# Altium schematic symbol library Regulator_Switching.SchLib: 1070 symbols (part 6 of 9)
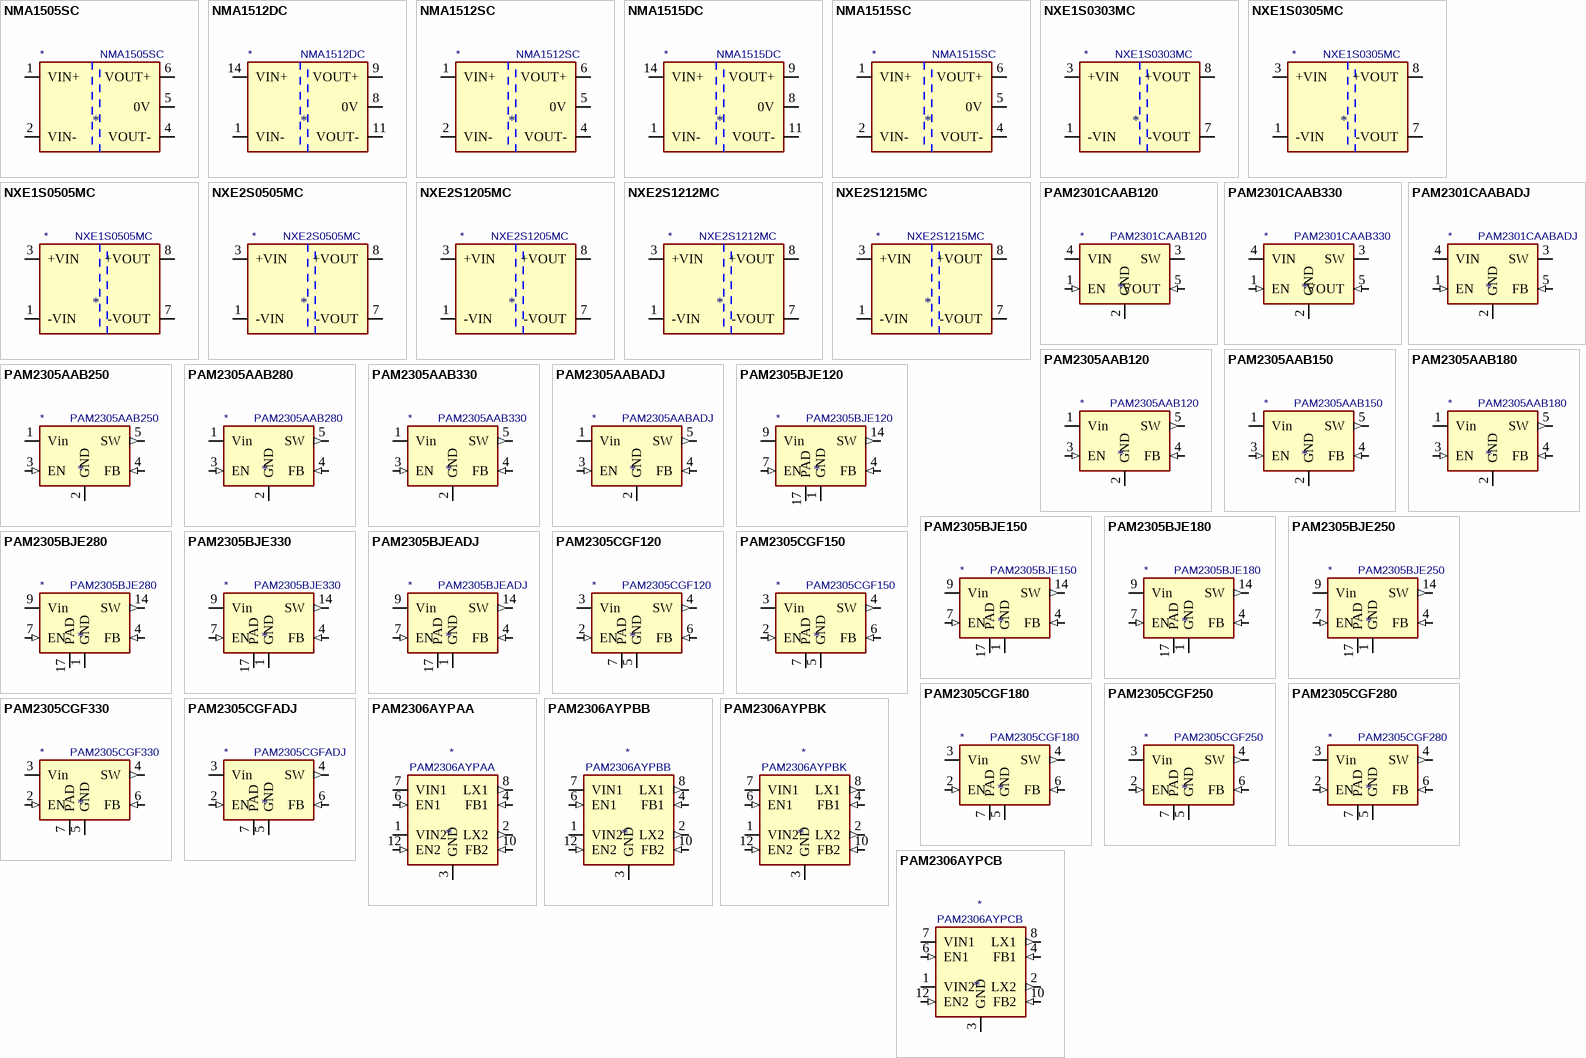
[diagram p31: symbols NMA1505SC to PAM2306AYPCB]

## PAM2301CAAB330
designator *  value PAM2301CAAB330
ki_keywords: Voltage regulator switching buck fixed output analog; ki_description: 800mA, Step-Down DC/DC-Converter, 3.3V Fixed Output Voltage, 1.5MHz, TSOT-23-5; ki_fp_filters: TSOT?23*; Footprint: Package_TO_SOT_SMD:TSOT-23-5; Supplier: https://www.diodes.com/assets/Datasheets/products_inactive_data/PAM2301.pdf
footprint TSOT-23-5
pins: 1 EN (in), 2 GND (power), 3 SW (power), 4 VIN (power), 5 VOUT (in)

## PAM2301CAABADJ
designator *  value PAM2301CAABADJ
ki_keywords: Voltage regulator switching buck fixed output analog; ki_description: 800mA, Step-Down DC/DC-Converter, Adjustable Output Voltage, 1.5MHz, TSOT-23-5; ki_fp_filters: TSOT?23*; Footprint: Package_TO_SOT_SMD:TSOT-23-5; Supplier: https://www.diodes.com/assets/Datasheets/products_inactive_data/PAM2301.pdf
footprint TSOT-23-5
pins: 1 EN (in), 2 GND (power), 3 SW (power), 4 VIN (power), 5 FB (in)

## PAM2305AAB120
designator *  value PAM2305AAB120
ki_keywords: Voltage regulator switching buck fixed output analog; ki_description: 1A, Step-Down DC/DC-Converter, 1.2V Fixed Output Voltage, 1.5MHz, TSOT-23; ki_fp_filters: TSOT?23*; Footprint: Package_TO_SOT_SMD:TSOT-23-5; Supplier: https://www.diodes.com/assets/Datasheets/PAM2305.pdf
footprint TSOT-23-5
pins: 1 Vin (power), 2 GND (power), 3 EN (in), 4 FB (in), 5 SW (out)

## PAM2305AAB150
designator *  value PAM2305AAB150
ki_keywords: Voltage regulator switching buck fixed output analog; ki_description: 1A, Step-Down DC/DC-Converter, 1.5V Fixed Output Voltage, 1.5MHz, TSOT-23; ki_fp_filters: TSOT?23*; Footprint: Package_TO_SOT_SMD:TSOT-23-5; Supplier: https://www.diodes.com/assets/Datasheets/PAM2305.pdf
footprint TSOT-23-5
pins: 1 Vin (power), 2 GND (power), 3 EN (in), 4 FB (in), 5 SW (out)

## PAM2305AAB180
designator *  value PAM2305AAB180
ki_keywords: Voltage regulator switching buck fixed output analog; ki_description: 1A, Step-Down DC/DC-Converter, 1.8V Fixed Output Voltage, 1.5MHz, TSOT-23; ki_fp_filters: TSOT?23*; Footprint: Package_TO_SOT_SMD:TSOT-23-5; Supplier: https://www.diodes.com/assets/Datasheets/PAM2305.pdf
footprint TSOT-23-5
pins: 1 Vin (power), 2 GND (power), 3 EN (in), 4 FB (in), 5 SW (out)

## PAM2305AAB250
designator *  value PAM2305AAB250
ki_keywords: Voltage regulator switching buck fixed output analog; ki_description: 1A, Step-Down DC/DC-Converter, 2.5V Fixed Output Voltage, 1.5MHz, TSOT-23; ki_fp_filters: TSOT?23*; Footprint: Package_TO_SOT_SMD:TSOT-23-5; Supplier: https://www.diodes.com/assets/Datasheets/PAM2305.pdf
footprint TSOT-23-5
pins: 1 Vin (power), 2 GND (power), 3 EN (in), 4 FB (in), 5 SW (out)

## PAM2305AAB280
designator *  value PAM2305AAB280
ki_keywords: Voltage regulator switching buck fixed output analog; ki_description: 1A, Step-Down DC/DC-Converter, 2.8V Fixed Output Voltage, 1.5MHz, TSOT-23; ki_fp_filters: TSOT?23*; Footprint: Package_TO_SOT_SMD:TSOT-23-5; Supplier: https://www.diodes.com/assets/Datasheets/PAM2305.pdf
footprint TSOT-23-5
pins: 1 Vin (power), 2 GND (power), 3 EN (in), 4 FB (in), 5 SW (out)

## PAM2305AAB330
designator *  value PAM2305AAB330
ki_keywords: Voltage regulator switching buck fixed output analog; ki_description: 1A, Step-Down DC/DC-Converter, 3.3V Fixed Output Voltage, 1.5MHz, TSOT-23; ki_fp_filters: TSOT?23*; Footprint: Package_TO_SOT_SMD:TSOT-23-5; Supplier: https://www.diodes.com/assets/Datasheets/PAM2305.pdf
footprint TSOT-23-5
pins: 1 Vin (power), 2 GND (power), 3 EN (in), 4 FB (in), 5 SW (out)

## PAM2305AABADJ
designator *  value PAM2305AABADJ
ki_keywords: Voltage regulator switching buck fixed output analog; ki_description: 1A, Step-Down DC/DC-Converter, Adjustable Output Voltage, 1.5MHz, TSOT-23; ki_fp_filters: TSOT?23*; Footprint: Package_TO_SOT_SMD:TSOT-23-5; Supplier: https://www.diodes.com/assets/Datasheets/PAM2305.pdf
footprint TSOT-23-5
pins: 1 Vin (power), 2 GND (power), 3 EN (in), 4 FB (in), 5 SW (out)

## PAM2305BJE120
designator *  value PAM2305BJE120
ki_keywords: Voltage regulator switching buck fixed output analog; ki_description: 1A, Step-Down DC/DC-Converter, 1.2V Fixed Output Voltage, 1.5MHz, QFN-16; ki_fp_filters: QFN*EP*3x3mm*P0.5mm*; Footprint: Package_DFN_QFN:QFN-16-1EP_3x3mm_P0.5mm_EP1.7x1.7mm; Supplier: https://www.diodes.com/assets/Datasheets/PAM2305.pdf
footprint QFN-16-1EP_3x3mm_P0.5mm_EP1.7x1.7mm
pins: 1 GND (power), 2 GND hidden, 3 GND hidden, 4 FB (in), 5 GND hidden, 6 NC (in) hidden, 7 EN (in), 8 NC (in) hidden, 9 Vin (power), 10 Vin hidden, 11 Vin hidden, 12 Vin hidden, 13 SW hidden, 14 SW (out), 15 SW hidden, 16 NC (in) hidden, 17 PAD

## PAM2305BJE150
designator *  value PAM2305BJE150
ki_keywords: Voltage regulator switching buck fixed output analog; ki_description: 1A, Step-Down DC/DC-Converter, 1.5V Fixed Output Voltage, 1.5MHz, QFN-16; ki_fp_filters: QFN*EP*3x3mm*P0.5mm*; Footprint: Package_DFN_QFN:QFN-16-1EP_3x3mm_P0.5mm_EP1.7x1.7mm; Supplier: https://www.diodes.com/assets/Datasheets/PAM2305.pdf
footprint QFN-16-1EP_3x3mm_P0.5mm_EP1.7x1.7mm
pins: 1 GND (power), 2 GND hidden, 3 GND hidden, 4 FB (in), 5 GND hidden, 6 NC (in) hidden, 7 EN (in), 8 NC (in) hidden, 9 Vin (power), 10 Vin hidden, 11 Vin hidden, 12 Vin hidden, 13 SW hidden, 14 SW (out), 15 SW hidden, 16 NC (in) hidden, 17 PAD

## PAM2305BJE180
designator *  value PAM2305BJE180
ki_keywords: Voltage regulator switching buck fixed output analog; ki_description: 1A, Step-Down DC/DC-Converter, 1.8V Fixed Output Voltage, 1.5MHz, QFN-16; ki_fp_filters: QFN*EP*3x3mm*P0.5mm*; Footprint: Package_DFN_QFN:QFN-16-1EP_3x3mm_P0.5mm_EP1.7x1.7mm; Supplier: https://www.diodes.com/assets/Datasheets/PAM2305.pdf
footprint QFN-16-1EP_3x3mm_P0.5mm_EP1.7x1.7mm
pins: 1 GND (power), 2 GND hidden, 3 GND hidden, 4 FB (in), 5 GND hidden, 6 NC (in) hidden, 7 EN (in), 8 NC (in) hidden, 9 Vin (power), 10 Vin hidden, 11 Vin hidden, 12 Vin hidden, 13 SW hidden, 14 SW (out), 15 SW hidden, 16 NC (in) hidden, 17 PAD

## PAM2305BJE250
designator *  value PAM2305BJE250
ki_keywords: Voltage regulator switching buck fixed output analog; ki_description: 1A, Step-Down DC/DC-Converter, 2.5V Fixed Output Voltage, 1.5MHz, QFN-16; ki_fp_filters: QFN*EP*3x3mm*P0.5mm*; Footprint: Package_DFN_QFN:QFN-16-1EP_3x3mm_P0.5mm_EP1.7x1.7mm; Supplier: https://www.diodes.com/assets/Datasheets/PAM2305.pdf
footprint QFN-16-1EP_3x3mm_P0.5mm_EP1.7x1.7mm
pins: 1 GND (power), 2 GND hidden, 3 GND hidden, 4 FB (in), 5 GND hidden, 6 NC (in) hidden, 7 EN (in), 8 NC (in) hidden, 9 Vin (power), 10 Vin hidden, 11 Vin hidden, 12 Vin hidden, 13 SW hidden, 14 SW (out), 15 SW hidden, 16 NC (in) hidden, 17 PAD

## PAM2305BJE280
designator *  value PAM2305BJE280
ki_keywords: Voltage regulator switching buck fixed output analog; ki_description: 1A, Step-Down DC/DC-Converter, 2.8V Fixed Output Voltage, 1.5MHz, QFN-16; ki_fp_filters: QFN*EP*3x3mm*P0.5mm*; Footprint: Package_DFN_QFN:QFN-16-1EP_3x3mm_P0.5mm_EP1.7x1.7mm; Supplier: https://www.diodes.com/assets/Datasheets/PAM2305.pdf
footprint QFN-16-1EP_3x3mm_P0.5mm_EP1.7x1.7mm
pins: 1 GND (power), 2 GND hidden, 3 GND hidden, 4 FB (in), 5 GND hidden, 6 NC (in) hidden, 7 EN (in), 8 NC (in) hidden, 9 Vin (power), 10 Vin hidden, 11 Vin hidden, 12 Vin hidden, 13 SW hidden, 14 SW (out), 15 SW hidden, 16 NC (in) hidden, 17 PAD

## PAM2305BJE330
designator *  value PAM2305BJE330
ki_keywords: Voltage regulator switching buck fixed output analog; ki_description: 1A, Step-Down DC/DC-Converter, 3.3V Fixed Output Voltage, 1.5MHz, QFN-16; ki_fp_filters: QFN*EP*3x3mm*P0.5mm*; Footprint: Package_DFN_QFN:QFN-16-1EP_3x3mm_P0.5mm_EP1.7x1.7mm; Supplier: https://www.diodes.com/assets/Datasheets/PAM2305.pdf
footprint QFN-16-1EP_3x3mm_P0.5mm_EP1.7x1.7mm
pins: 1 GND (power), 2 GND hidden, 3 GND hidden, 4 FB (in), 5 GND hidden, 6 NC (in) hidden, 7 EN (in), 8 NC (in) hidden, 9 Vin (power), 10 Vin hidden, 11 Vin hidden, 12 Vin hidden, 13 SW hidden, 14 SW (out), 15 SW hidden, 16 NC (in) hidden, 17 PAD

## PAM2305BJEADJ
designator *  value PAM2305BJEADJ
ki_keywords: Voltage regulator switching buck fixed output analog; ki_description: 1A, Step-Down DC/DC-Converter, Adjustable Output Voltage, 1.5MHz, QFN-16; ki_fp_filters: QFN*EP*3x3mm*P0.5mm*; Footprint: Package_DFN_QFN:QFN-16-1EP_3x3mm_P0.5mm_EP1.7x1.7mm; Supplier: https://www.diodes.com/assets/Datasheets/PAM2305.pdf
footprint QFN-16-1EP_3x3mm_P0.5mm_EP1.7x1.7mm
pins: 1 GND (power), 2 GND hidden, 3 GND hidden, 4 FB (in), 5 GND hidden, 6 NC (in) hidden, 7 EN (in), 8 NC (in) hidden, 9 Vin (power), 10 Vin hidden, 11 Vin hidden, 12 Vin hidden, 13 SW hidden, 14 SW (out), 15 SW hidden, 16 NC (in) hidden, 17 PAD

## PAM2305CGF120
designator *  value PAM2305CGF120
ki_keywords: Voltage regulator switching buck fixed output analog; ki_description: 1A, Step-Down DC/DC-Converter, 1.2V Fixed Output Voltage, 1.5MHz, DFN-6; ki_fp_filters: DFN*EP*2x2mm*P0.65mm*; Footprint: Package_DFN_QFN:DFN-6-1EP_2x2mm_P0.65mm_EP1x1.6mm; Supplier: https://www.diodes.com/assets/Datasheets/PAM2305.pdf
footprint DFN-6-1EP_2x2mm_P0.65mm_EP1x1.6mm
pins: 1 NC (in) hidden, 2 EN (in), 3 Vin (power), 4 SW (out), 5 GND (power), 6 FB (in), 7 PAD

## PAM2305CGF150
designator *  value PAM2305CGF150
ki_keywords: Voltage regulator switching buck fixed output analog; ki_description: 1A, Step-Down DC/DC-Converter, 1.5V Fixed Output Voltage, 1.5MHz, DFN-6; ki_fp_filters: DFN*EP*2x2mm*P0.65mm*; Footprint: Package_DFN_QFN:DFN-6-1EP_2x2mm_P0.65mm_EP1x1.6mm; Supplier: https://www.diodes.com/assets/Datasheets/PAM2305.pdf
footprint DFN-6-1EP_2x2mm_P0.65mm_EP1x1.6mm
pins: 1 NC (in) hidden, 2 EN (in), 3 Vin (power), 4 SW (out), 5 GND (power), 6 FB (in), 7 PAD

## PAM2305CGF180
designator *  value PAM2305CGF180
ki_keywords: Voltage regulator switching buck fixed output analog; ki_description: 1A, Step-Down DC/DC-Converter, 1.8V Fixed Output Voltage, 1.5MHz, DFN-6; ki_fp_filters: DFN*EP*2x2mm*P0.65mm*; Footprint: Package_DFN_QFN:DFN-6-1EP_2x2mm_P0.65mm_EP1x1.6mm; Supplier: https://www.diodes.com/assets/Datasheets/PAM2305.pdf
footprint DFN-6-1EP_2x2mm_P0.65mm_EP1x1.6mm
pins: 1 NC (in) hidden, 2 EN (in), 3 Vin (power), 4 SW (out), 5 GND (power), 6 FB (in), 7 PAD

## PAM2305CGF250
designator *  value PAM2305CGF250
ki_keywords: Voltage regulator switching buck fixed output analog; ki_description: 1A, Step-Down DC/DC-Converter, 2.5V Fixed Output Voltage, 1.5MHz, DFN-6; ki_fp_filters: DFN*EP*2x2mm*P0.65mm*; Footprint: Package_DFN_QFN:DFN-6-1EP_2x2mm_P0.65mm_EP1x1.6mm; Supplier: https://www.diodes.com/assets/Datasheets/PAM2305.pdf
footprint DFN-6-1EP_2x2mm_P0.65mm_EP1x1.6mm
pins: 1 NC (in) hidden, 2 EN (in), 3 Vin (power), 4 SW (out), 5 GND (power), 6 FB (in), 7 PAD

## PAM2305CGF280
designator *  value PAM2305CGF280
ki_keywords: Voltage regulator switching buck fixed output analog; ki_description: 1A, Step-Down DC/DC-Converter, 2.8V Fixed Output Voltage, 1.5MHz, DFN-6; ki_fp_filters: DFN*EP*2x2mm*P0.65mm*; Footprint: Package_DFN_QFN:DFN-6-1EP_2x2mm_P0.65mm_EP1x1.6mm; Supplier: https://www.diodes.com/assets/Datasheets/PAM2305.pdf
footprint DFN-6-1EP_2x2mm_P0.65mm_EP1x1.6mm
pins: 1 NC (in) hidden, 2 EN (in), 3 Vin (power), 4 SW (out), 5 GND (power), 6 FB (in), 7 PAD

## PAM2305CGF330
designator *  value PAM2305CGF330
ki_keywords: Voltage regulator switching buck fixed output analog; ki_description: 1A, Step-Down DC/DC-Converter, 3.3V Fixed Output Voltage, 1.5MHz, DFN-6; ki_fp_filters: DFN*EP*2x2mm*P0.65mm*; Footprint: Package_DFN_QFN:DFN-6-1EP_2x2mm_P0.65mm_EP1x1.6mm; Supplier: https://www.diodes.com/assets/Datasheets/PAM2305.pdf
footprint DFN-6-1EP_2x2mm_P0.65mm_EP1x1.6mm
pins: 1 NC (in) hidden, 2 EN (in), 3 Vin (power), 4 SW (out), 5 GND (power), 6 FB (in), 7 PAD

## PAM2305CGFADJ
designator *  value PAM2305CGFADJ
ki_keywords: Voltage regulator switching buck fixed output analog; ki_description: 1A, Step-Down DC/DC-Converter, Adjustable Output Voltage, 1.5MHz, DFN-6; ki_fp_filters: DFN*EP*2x2mm*P0.65mm*; Footprint: Package_DFN_QFN:DFN-6-1EP_2x2mm_P0.65mm_EP1x1.6mm; Supplier: https://www.diodes.com/assets/Datasheets/PAM2305.pdf
footprint DFN-6-1EP_2x2mm_P0.65mm_EP1x1.6mm
pins: 1 NC (in) hidden, 2 EN (in), 3 Vin (power), 4 SW (out), 5 GND (power), 6 FB (in), 7 PAD

## PAM2306AYPAA
designator *  value PAM2306AYPAA
ki_keywords: STEP-DOWN Dual channel 1A Out1 ADJ, Out2 ADJ; ki_description: 1A, Dual Step-Down DC/DC-Converter, Out1 ADJ, Out2 ADJ, 1.5MHz, W-DFN3x3; ki_fp_filters: WDFN*3x3mm?P0.45mm*; Footprint: Package_DFN_QFN:WDFN-12-1EP_3x3mm_P0.45mm_EP1.7x2.5mm; Supplier: https://www.diodes.com/assets/Datasheets/PAM2306.pdf
footprint WDFN-12-1EP_3x3mm_P0.45mm_EP1.7x2.5mm
pins: 1 VIN2 (power), 2 LX2 (out), 3 GND (power), 4 FB1 (in), 5 NC1 (in) hidden, 6 EN1 (in), 7 VIN1 (power), 8 LX1 (out), 9 GND hidden, 10 FB2 (in), 11 NC2 (in) hidden, 12 EN2 (in), 13 GND hidden

## PAM2306AYPBB
designator *  value PAM2306AYPBB
ki_keywords: STEP-DOWN Dual channel 1A Out1 1.2V, Out2 1.2V; ki_description: 1A, Dual Step-Down DC/DC-Converter, Out1 1.2V, Out2 1.2V, 1.5MHz, W-DFN3x3; ki_fp_filters: WDFN*3x3mm?P0.45mm*; Footprint: Package_DFN_QFN:WDFN-12-1EP_3x3mm_P0.45mm_EP1.7x2.5mm; Supplier: https://www.diodes.com/assets/Datasheets/PAM2306.pdf
footprint WDFN-12-1EP_3x3mm_P0.45mm_EP1.7x2.5mm
pins: 1 VIN2 (power), 2 LX2 (out), 3 GND (power), 4 FB1 (in), 5 NC1 (in) hidden, 6 EN1 (in), 7 VIN1 (power), 8 LX1 (out), 9 GND hidden, 10 FB2 (in), 11 NC2 (in) hidden, 12 EN2 (in), 13 GND hidden

## PAM2306AYPBK
designator *  value PAM2306AYPBK
ki_keywords: STEP-DOWN Dual channel 1A Out1 1.5V, Out2 3.3V; ki_description: 1A, Dual Step-Down DC/DC-Converter, Out1 1.2V, Out2 3.3V, 1.5MHz, W-DFN3x3; ki_fp_filters: WDFN*3x3mm?P0.45mm*; Footprint: Package_DFN_QFN:WDFN-12-1EP_3x3mm_P0.45mm_EP1.7x2.5mm; Supplier: https://www.diodes.com/assets/Datasheets/PAM2306.pdf
footprint WDFN-12-1EP_3x3mm_P0.45mm_EP1.7x2.5mm
pins: 1 VIN2 (power), 2 LX2 (out), 3 GND (power), 4 FB1 (in), 5 NC1 (in) hidden, 6 EN1 (in), 7 VIN1 (power), 8 LX1 (out), 9 GND hidden, 10 FB2 (in), 11 NC2 (in) hidden, 12 EN2 (in), 13 GND hidden

## PAM2306AYPCB
designator *  value PAM2306AYPCB
ki_keywords: STEP-DOWN Dual channel 1A Out1 1.5V, Out2 1.2V; ki_description: 1A, Dual Step-Down DC/DC-Converter, Out1 1.5V, Out2 1.2V, 1.5MHz, W-DFN3x3; ki_fp_filters: WDFN*3x3mm?P0.45mm*; Footprint: Package_DFN_QFN:WDFN-12-1EP_3x3mm_P0.45mm_EP1.7x2.5mm; Supplier: https://www.diodes.com/assets/Datasheets/PAM2306.pdf
footprint WDFN-12-1EP_3x3mm_P0.45mm_EP1.7x2.5mm
pins: 1 VIN2 (power), 2 LX2 (out), 3 GND (power), 4 FB1 (in), 5 NC1 (in) hidden, 6 EN1 (in), 7 VIN1 (power), 8 LX1 (out), 9 GND hidden, 10 FB2 (in), 11 NC2 (in) hidden, 12 EN2 (in), 13 GND hidden

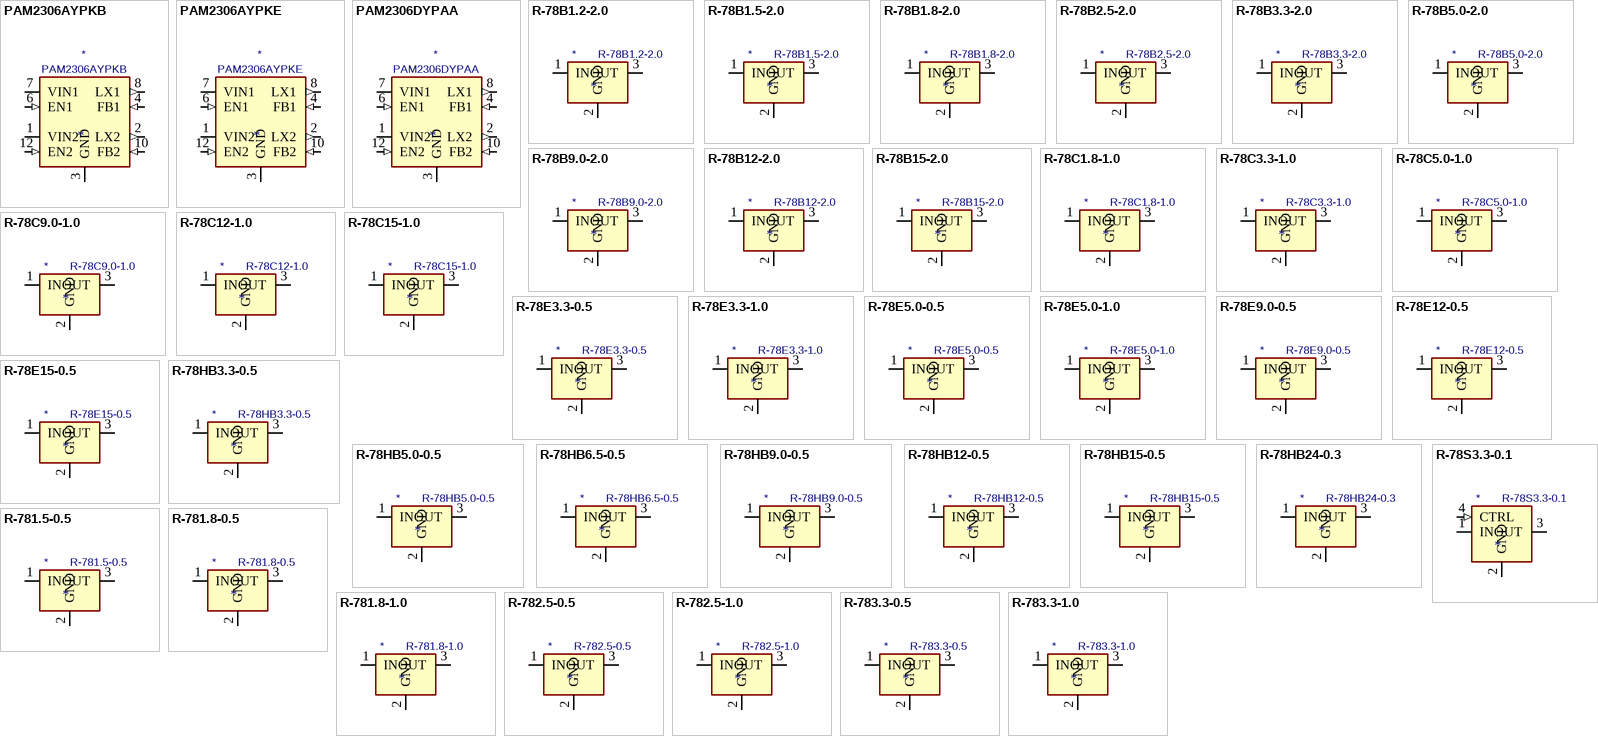
[diagram p17: symbols PAM2306AYPKB to R-783.3-1.0]

## PAM2306AYPKB
designator *  value PAM2306AYPKB
ki_keywords: STEP-DOWN Dual channel 1A Out1 3.3V, Out2 1.2V; ki_description: 1A, Dual Step-Down DC/DC-Converter, Out1 3.3V, Out2 1.2V, 1.5MHz, W-DFN3x3; ki_fp_filters: WDFN*3x3mm?P0.45mm*; Footprint: Package_DFN_QFN:WDFN-12-1EP_3x3mm_P0.45mm_EP1.7x2.5mm; Supplier: https://www.diodes.com/assets/Datasheets/PAM2306.pdf
footprint WDFN-12-1EP_3x3mm_P0.45mm_EP1.7x2.5mm
pins: 1 VIN2 (power), 2 LX2 (out), 3 GND (power), 4 FB1 (in), 5 NC1 (in) hidden, 6 EN1 (in), 7 VIN1 (power), 8 LX1 (out), 9 GND hidden, 10 FB2 (in), 11 NC2 (in) hidden, 12 EN2 (in), 13 GND hidden

## PAM2306AYPKE
designator *  value PAM2306AYPKE
ki_keywords: STEP-DOWN Dual channel 1A Out1 3.3V, Out2 1.8V; ki_description: 1A, Dual Step-Down DC/DC-Converter, Out1 3.3V, Out2 1.8V, 1.5MHz, W-DFN3x3; ki_fp_filters: WDFN*3x3mm?P0.45mm*; Footprint: Package_DFN_QFN:WDFN-12-1EP_3x3mm_P0.45mm_EP1.7x2.5mm; Supplier: https://www.diodes.com/assets/Datasheets/PAM2306.pdf
footprint WDFN-12-1EP_3x3mm_P0.45mm_EP1.7x2.5mm
pins: 1 VIN2 (power), 2 LX2 (out), 3 GND (power), 4 FB1 (in), 5 NC1 (in) hidden, 6 EN1 (in), 7 VIN1 (power), 8 LX1 (out), 9 GND hidden, 10 FB2 (in), 11 NC2 (in) hidden, 12 EN2 (in), 13 GND hidden

## PAM2306DYPAA
designator *  value PAM2306DYPAA
ki_keywords: STEP-DOWN Dual channel 1A Out1 ADJ, Out2 ADJ; ki_description: 1A, Dual Step-Down DC/DC-Converter, Out1 ADJ, Out2 ADJ, 1.5MHz, W-DFN3x3; ki_fp_filters: WDFN*3x3mm?P0.45mm*; Footprint: Package_DFN_QFN:WDFN-12-1EP_3x3mm_P0.45mm_EP1.7x2.5mm; Supplier: https://www.diodes.com/assets/Datasheets/PAM2306D.pdf
footprint WDFN-12-1EP_3x3mm_P0.45mm_EP1.7x2.5mm
pins: 1 VIN2 (power), 2 LX2 (out), 3 GND (power), 4 FB1 (in), 5 NC1 (in) hidden, 6 EN1 (in), 7 VIN1 (power), 8 LX1 (out), 9 GND hidden, 10 FB2 (in), 11 NC2 (in) hidden, 12 EN2 (in), 13 GND hidden

## R-78B1.2-2.0
designator *  value R-78B1.2-2.0
ki_keywords: dc-dc recom Step-Down DC/DC-Regulator; ki_description: 2A Step-Down DC/DC-Regulator, 4.75-32V input, 1.2V fixed Output Voltage, LM78xx replacement, -40°C to +85°C, SIP3; ki_fp_filters: Converter*DCDC*RECOM*R*78B*2.0*; Footprint: Converter_DCDC:Converter_DCDC_RECOM_R-78B-2.0_THT; Supplier: https://www.recom-power.com/pdf/Innoline/R-78Bxx-2.0.pdf
footprint Converter_DCDC_RECOM_R-78B-2.0_THT
pins: 1 IN (power), 2 GND (power), 3 OUT (power)

## R-78B1.5-2.0
designator *  value R-78B1.5-2.0
ki_keywords: dc-dc recom Step-Down DC/DC-Regulator; ki_description: 2A Step-Down DC/DC-Regulator, 4.75-32V input, 1.5V fixed Output Voltage, LM78xx replacement, -40°C to +85°C, SIP3; ki_fp_filters: Converter*DCDC*RECOM*R*78B*2.0*; Footprint: Converter_DCDC:Converter_DCDC_RECOM_R-78B-2.0_THT; Supplier: https://www.recom-power.com/pdf/Innoline/R-78Bxx-2.0.pdf
footprint Converter_DCDC_RECOM_R-78B-2.0_THT
pins: 1 IN (power), 2 GND (power), 3 OUT (power)

## R-78B1.8-2.0
designator *  value R-78B1.8-2.0
ki_keywords: dc-dc recom Step-Down DC/DC-Regulator; ki_description: 2A Step-Down DC/DC-Regulator, 4.75-32V input, 1.8V fixed Output Voltage, LM78xx replacement, -40°C to +85°C, SIP3; ki_fp_filters: Converter*DCDC*RECOM*R*78B*2.0*; Footprint: Converter_DCDC:Converter_DCDC_RECOM_R-78B-2.0_THT; Supplier: https://www.recom-power.com/pdf/Innoline/R-78Bxx-2.0.pdf
footprint Converter_DCDC_RECOM_R-78B-2.0_THT
pins: 1 IN (power), 2 GND (power), 3 OUT (power)

## R-78B2.5-2.0
designator *  value R-78B2.5-2.0
ki_keywords: dc-dc recom Step-Down DC/DC-Regulator; ki_description: 2A Step-Down DC/DC-Regulator, 4.75-32V input, 2.5V fixed Output Voltage, LM78xx replacement, -40°C to +85°C, SIP3; ki_fp_filters: Converter*DCDC*RECOM*R*78B*2.0*; Footprint: Converter_DCDC:Converter_DCDC_RECOM_R-78B-2.0_THT; Supplier: https://www.recom-power.com/pdf/Innoline/R-78Bxx-2.0.pdf
footprint Converter_DCDC_RECOM_R-78B-2.0_THT
pins: 1 IN (power), 2 GND (power), 3 OUT (power)

## R-78B3.3-2.0
designator *  value R-78B3.3-2.0
ki_keywords: dc-dc recom Step-Down DC/DC-Regulator; ki_description: 2A Step-Down DC/DC-Regulator, 4.75-32V input, 3.3V fixed Output Voltage, LM78xx replacement, -40°C to +85°C, SIP3; ki_fp_filters: Converter*DCDC*RECOM*R*78B*2.0*; Footprint: Converter_DCDC:Converter_DCDC_RECOM_R-78B-2.0_THT; Supplier: https://www.recom-power.com/pdf/Innoline/R-78Bxx-2.0.pdf
footprint Converter_DCDC_RECOM_R-78B-2.0_THT
pins: 1 IN (power), 2 GND (power), 3 OUT (power)

## R-78B5.0-2.0
designator *  value R-78B5.0-2.0
ki_keywords: dc-dc recom Step-Down DC/DC-Regulator; ki_description: 2A Step-Down DC/DC-Regulator, 6.5-32V input, 5.0V fixed Output Voltage, LM78xx replacement, -40°C to +85°C, SIP3; ki_fp_filters: Converter*DCDC*RECOM*R*78B*2.0*; Footprint: Converter_DCDC:Converter_DCDC_RECOM_R-78B-2.0_THT; Supplier: https://www.recom-power.com/pdf/Innoline/R-78Bxx-2.0.pdf
footprint Converter_DCDC_RECOM_R-78B-2.0_THT
pins: 1 IN (power), 2 GND (power), 3 OUT (power)

## R-78B9.0-2.0
designator *  value R-78B9.0-2.0
ki_keywords: dc-dc recom Step-Down DC/DC-Regulator; ki_description: 2A Step-Down DC/DC-Regulator, 11-32V input, 9.0V fixed Output Voltage, LM78xx replacement, -40°C to +85°C, SIP3; ki_fp_filters: Converter*DCDC*RECOM*R*78B*2.0*; Footprint: Converter_DCDC:Converter_DCDC_RECOM_R-78B-2.0_THT; Supplier: https://www.recom-power.com/pdf/Innoline/R-78Bxx-2.0.pdf
footprint Converter_DCDC_RECOM_R-78B-2.0_THT
pins: 1 IN (power), 2 GND (power), 3 OUT (power)

## R-78B12-2.0
designator *  value R-78B12-2.0
ki_keywords: dc-dc recom Step-Down DC/DC-Regulator; ki_description: 2A Step-Down DC/DC-Regulator, 15-32V input, 12V fixed Output Voltage, LM78xx replacement, -40°C to +85°C, SIP3; ki_fp_filters: Converter*DCDC*RECOM*R*78B*2.0*; Footprint: Converter_DCDC:Converter_DCDC_RECOM_R-78B-2.0_THT; Supplier: https://www.recom-power.com/pdf/Innoline/R-78Bxx-2.0.pdf
footprint Converter_DCDC_RECOM_R-78B-2.0_THT
pins: 1 IN (power), 2 GND (power), 3 OUT (power)

## R-78B15-2.0
designator *  value R-78B15-2.0
ki_keywords: dc-dc recom Step-Down DC/DC-Regulator; ki_description: 2A Step-Down DC/DC-Regulator, 18-32V input, 15V fixed Output Voltage, LM78xx replacement, -40°C to +85°C, SIP3; ki_fp_filters: Converter*DCDC*RECOM*R*78B*2.0*; Footprint: Converter_DCDC:Converter_DCDC_RECOM_R-78B-2.0_THT; Supplier: https://www.recom-power.com/pdf/Innoline/R-78Bxx-2.0.pdf
footprint Converter_DCDC_RECOM_R-78B-2.0_THT
pins: 1 IN (power), 2 GND (power), 3 OUT (power)

## R-78C1.8-1.0
designator *  value R-78C1.8-1.0
ki_keywords: dc-dc recom Step-Down DC/DC-Regulator; ki_description: 1A Step-Down DC/DC-Regulator, 5-42V input, 1.8V fixed Output Voltage, LM78xx replacement, -40°C to +85°C, SIP3; ki_fp_filters: Converter*DCDC*RECOM*R*78E*0.5*; Footprint: Converter_DCDC:Converter_DCDC_RECOM_R-78E-0.5_THT; Supplier: https://www.recom-power.com/pdf/Innoline/R-78Cxx-1.0.pdf
footprint Converter_DCDC_RECOM_R-78E-0.5_THT
pins: 1 IN (power), 2 GND (power), 3 OUT (power)

## R-78C3.3-1.0
designator *  value R-78C3.3-1.0
ki_keywords: dc-dc recom Step-Down DC/DC-Regulator; ki_description: 1A Step-Down DC/DC-Regulator, 6-42V input, 3.3V fixed Output Voltage, LM78xx replacement, -40°C to +85°C, SIP3; ki_fp_filters: Converter*DCDC*RECOM*R*78E*0.5*; Footprint: Converter_DCDC:Converter_DCDC_RECOM_R-78E-0.5_THT; Supplier: https://www.recom-power.com/pdf/Innoline/R-78Cxx-1.0.pdf
footprint Converter_DCDC_RECOM_R-78E-0.5_THT
pins: 1 IN (power), 2 GND (power), 3 OUT (power)

## R-78C5.0-1.0
designator *  value R-78C5.0-1.0
ki_keywords: dc-dc recom Step-Down DC/DC-Regulator; ki_description: 1A Step-Down DC/DC-Regulator, 7-42V input, 5V fixed Output Voltage, LM78xx replacement, -40°C to +85°C, SIP3; ki_fp_filters: Converter*DCDC*RECOM*R*78E*0.5*; Footprint: Converter_DCDC:Converter_DCDC_RECOM_R-78E-0.5_THT; Supplier: https://www.recom-power.com/pdf/Innoline/R-78Cxx-1.0.pdf
footprint Converter_DCDC_RECOM_R-78E-0.5_THT
pins: 1 IN (power), 2 GND (power), 3 OUT (power)

## R-78C9.0-1.0
designator *  value R-78C9.0-1.0
ki_keywords: dc-dc recom Step-Down DC/DC-Regulator; ki_description: 1A Step-Down DC/DC-Regulator, 12-42V input, 9V fixed Output Voltage, LM78xx replacement, -40°C to +85°C, SIP3; ki_fp_filters: Converter*DCDC*RECOM*R*78E*0.5*; Footprint: Converter_DCDC:Converter_DCDC_RECOM_R-78E-0.5_THT; Supplier: https://www.recom-power.com/pdf/Innoline/R-78Cxx-1.0.pdf
footprint Converter_DCDC_RECOM_R-78E-0.5_THT
pins: 1 IN (power), 2 GND (power), 3 OUT (power)

## R-78C12-1.0
designator *  value R-78C12-1.0
ki_keywords: dc-dc recom Step-Down DC/DC-Regulator; ki_description: 1A Step-Down DC/DC-Regulator, 15-42V input, 12V fixed Output Voltage, LM78xx replacement, -40°C to +85°C, SIP3; ki_fp_filters: Converter*DCDC*RECOM*R*78E*0.5*; Footprint: Converter_DCDC:Converter_DCDC_RECOM_R-78E-0.5_THT; Supplier: https://www.recom-power.com/pdf/Innoline/R-78Cxx-1.0.pdf
footprint Converter_DCDC_RECOM_R-78E-0.5_THT
pins: 1 IN (power), 2 GND (power), 3 OUT (power)

## R-78C15-1.0
designator *  value R-78C15-1.0
ki_keywords: dc-dc recom Step-Down DC/DC-Regulator; ki_description: 1A Step-Down DC/DC-Regulator, 18-42V input, 15V fixed Output Voltage, LM78xx replacement, -40°C to +85°C, SIP3; ki_fp_filters: Converter*DCDC*RECOM*R*78E*0.5*; Footprint: Converter_DCDC:Converter_DCDC_RECOM_R-78E-0.5_THT; Supplier: https://www.recom-power.com/pdf/Innoline/R-78Cxx-1.0.pdf
footprint Converter_DCDC_RECOM_R-78E-0.5_THT
pins: 1 IN (power), 2 GND (power), 3 OUT (power)

## R-78E3.3-0.5
designator *  value R-78E3.3-0.5
ki_keywords: dc-dc recom Step-Down DC/DC-Regulator; ki_description: 500mA Step-Down DC/DC-Regulator, 6-28V input, 3.3V fixed Output Voltage, LM78xx replacement, -40°C to +85°C, SIP3; ki_fp_filters: Converter*DCDC*RECOM*R*78E*0.5*; Footprint: Converter_DCDC:Converter_DCDC_RECOM_R-78E-0.5_THT; Supplier: https://www.recom-power.com/pdf/Innoline/R-78Exx-0.5.pdf
footprint Converter_DCDC_RECOM_R-78E-0.5_THT
pins: 1 IN (power), 2 GND (power), 3 OUT (power)

## R-78E3.3-1.0
designator *  value R-78E3.3-1.0
ki_keywords: dc-dc recom Step-Down DC/DC-Regulator; ki_description: 1A Step-Down DC/DC-Regulator, 6-28V input, 3.3V fixed Output Voltage, LM78xx replacement, -40°C to +85°C, SIP3; ki_fp_filters: Converter*DCDC*RECOM*R*78E*0.5*; Footprint: Converter_DCDC:Converter_DCDC_RECOM_R-78E-0.5_THT; Supplier: https://www.recom-power.com/pdf/Innoline/R-78Exx-1.0.pdf
footprint Converter_DCDC_RECOM_R-78E-0.5_THT
pins: 1 IN (power), 2 GND (power), 3 OUT (power)

## R-78E5.0-0.5
designator *  value R-78E5.0-0.5
ki_keywords: dc-dc recom Step-Down DC/DC-Regulator; ki_description: 500mA Step-Down DC/DC-Regulator, 7-28V input, 5V fixed Output Voltage, LM78xx replacement, -40°C to +85°C, SIP3; ki_fp_filters: Converter*DCDC*RECOM*R*78E*0.5*; Footprint: Converter_DCDC:Converter_DCDC_RECOM_R-78E-0.5_THT; Supplier: https://www.recom-power.com/pdf/Innoline/R-78Exx-0.5.pdf
footprint Converter_DCDC_RECOM_R-78E-0.5_THT
pins: 1 IN (power), 2 GND (power), 3 OUT (power)

## R-78E5.0-1.0
designator *  value R-78E5.0-1.0
ki_keywords: dc-dc recom Step-Down DC/DC-Regulator; ki_description: 1A Step-Down DC/DC-Regulator, 7-28V input, 5V fixed Output Voltage, LM78xx replacement, -40°C to +85°C, SIP3; ki_fp_filters: Converter*DCDC*RECOM*R*78E*0.5*; Footprint: Converter_DCDC:Converter_DCDC_RECOM_R-78E-0.5_THT; Supplier: https://www.recom-power.com/pdf/Innoline/R-78Exx-1.0.pdf
footprint Converter_DCDC_RECOM_R-78E-0.5_THT
pins: 1 IN (power), 2 GND (power), 3 OUT (power)

## R-78E9.0-0.5
designator *  value R-78E9.0-0.5
ki_keywords: dc-dc recom Step-Down DC/DC-Regulator; ki_description: 500mA Step-Down DC/DC-Regulator, 12-28V input, 9V fixed Output Voltage, LM78xx replacement, -40°C to +85°C, SIP3; ki_fp_filters: Converter*DCDC*RECOM*R*78E*0.5*; Footprint: Converter_DCDC:Converter_DCDC_RECOM_R-78E-0.5_THT; Supplier: https://www.recom-power.com/pdf/Innoline/R-78Exx-0.5.pdf
footprint Converter_DCDC_RECOM_R-78E-0.5_THT
pins: 1 IN (power), 2 GND (power), 3 OUT (power)

## R-78E12-0.5
designator *  value R-78E12-0.5
ki_keywords: dc-dc recom Step-Down DC/DC-Regulator; ki_description: 500mA Step-Down DC/DC-Regulator, 15-28V input, 12V fixed Output Voltage, LM78xx replacement, -40°C to +85°C, SIP3; ki_fp_filters: Converter*DCDC*RECOM*R*78E*0.5*; Footprint: Converter_DCDC:Converter_DCDC_RECOM_R-78E-0.5_THT; Supplier: https://www.recom-power.com/pdf/Innoline/R-78Exx-0.5.pdf
footprint Converter_DCDC_RECOM_R-78E-0.5_THT
pins: 1 IN (power), 2 GND (power), 3 OUT (power)

## R-78E15-0.5
designator *  value R-78E15-0.5
ki_keywords: dc-dc recom Step-Down DC/DC-Regulator; ki_description: 500mA Step-Down DC/DC-Regulator, 18-28V input, 15V fixed Output Voltage, LM78xx replacement, -40°C to +85°C, SIP3; ki_fp_filters: Converter*DCDC*RECOM*R*78E*0.5*; Footprint: Converter_DCDC:Converter_DCDC_RECOM_R-78E-0.5_THT; Supplier: https://www.recom-power.com/pdf/Innoline/R-78Exx-0.5.pdf
footprint Converter_DCDC_RECOM_R-78E-0.5_THT
pins: 1 IN (power), 2 GND (power), 3 OUT (power)

## R-78HB3.3-0.5
designator *  value R-78HB3.3-0.5
ki_keywords: dc-dc recom Step-Down DC/DC-Regulator; ki_description: 500mA Step-Down DC/DC-Regulator, 9-72V input, 3.3V fixed Output Voltage, LM78xx replacement, -40°C to +85°C, SIP3; ki_fp_filters: Converter*DCDC*RECOM*R*78HB*0.5*; Footprint: Converter_DCDC:Converter_DCDC_RECOM_R-78HB-0.5_THT; Supplier: https://www.recom-power.com/pdf/Innoline/R-78HBxx-0.5_L.pdf
footprint Converter_DCDC_RECOM_R-78HB-0.5_THT
pins: 1 IN (power), 2 GND (power), 3 OUT (power)

## R-78HB5.0-0.5
designator *  value R-78HB5.0-0.5
ki_keywords: dc-dc recom Step-Down DC/DC-Regulator; ki_description: 500mA Step-Down DC/DC-Regulator, 9-72V input, 5.0V fixed Output Voltage, LM78xx replacement, -40°C to +85°C, SIP3; ki_fp_filters: Converter*DCDC*RECOM*R*78HB*0.5*; Footprint: Converter_DCDC:Converter_DCDC_RECOM_R-78HB-0.5_THT; Supplier: https://www.recom-power.com/pdf/Innoline/R-78HBxx-0.5_L.pdf
footprint Converter_DCDC_RECOM_R-78HB-0.5_THT
pins: 1 IN (power), 2 GND (power), 3 OUT (power)

## R-78HB6.5-0.5
designator *  value R-78HB6.5-0.5
ki_keywords: dc-dc recom Step-Down DC/DC-Regulator; ki_description: 500mA Step-Down DC/DC-Regulator, 9-72V input, 6.5V fixed Output Voltage, LM78xx replacement, -40°C to +85°C, SIP3; ki_fp_filters: Converter*DCDC*RECOM*R*78HB*0.5*; Footprint: Converter_DCDC:Converter_DCDC_RECOM_R-78HB-0.5_THT; Supplier: https://www.recom-power.com/pdf/Innoline/R-78HBxx-0.5_L.pdf
footprint Converter_DCDC_RECOM_R-78HB-0.5_THT
pins: 1 IN (power), 2 GND (power), 3 OUT (power)

## R-78HB9.0-0.5
designator *  value R-78HB9.0-0.5
ki_keywords: dc-dc recom Step-Down DC/DC-Regulator; ki_description: 500mA Step-Down DC/DC-Regulator, 14-72V input, 9.0V fixed Output Voltage, LM78xx replacement, -40°C to +85°C, SIP3; ki_fp_filters: Converter*DCDC*RECOM*R*78HB*0.5*; Footprint: Converter_DCDC:Converter_DCDC_RECOM_R-78HB-0.5_THT; Supplier: https://www.recom-power.com/pdf/Innoline/R-78HBxx-0.5_L.pdf
footprint Converter_DCDC_RECOM_R-78HB-0.5_THT
pins: 1 IN (power), 2 GND (power), 3 OUT (power)

## R-78HB12-0.5
designator *  value R-78HB12-0.5
ki_keywords: dc-dc recom Step-Down DC/DC-Regulator; ki_description: 500mA Step-Down DC/DC-Regulator, 17-72V input, 12V fixed Output Voltage, LM78xx replacement, -40°C to +85°C, SIP3; ki_fp_filters: Converter*DCDC*RECOM*R*78HB*0.5*; Footprint: Converter_DCDC:Converter_DCDC_RECOM_R-78HB-0.5_THT; Supplier: https://www.recom-power.com/pdf/Innoline/R-78HBxx-0.5_L.pdf
footprint Converter_DCDC_RECOM_R-78HB-0.5_THT
pins: 1 IN (power), 2 GND (power), 3 OUT (power)

## R-78HB15-0.5
designator *  value R-78HB15-0.5
ki_keywords: dc-dc recom Step-Down DC/DC-Regulator; ki_description: 500mA Step-Down DC/DC-Regulator, 20-72V input, 15V fixed Output Voltage, LM78xx replacement, -40°C to +85°C, SIP3; ki_fp_filters: Converter*DCDC*RECOM*R*78HB*0.5*; Footprint: Converter_DCDC:Converter_DCDC_RECOM_R-78HB-0.5_THT; Supplier: https://www.recom-power.com/pdf/Innoline/R-78HBxx-0.5_L.pdf
footprint Converter_DCDC_RECOM_R-78HB-0.5_THT
pins: 1 IN (power), 2 GND (power), 3 OUT (power)

## R-78HB24-0.3
designator *  value R-78HB24-0.3
ki_keywords: dc-dc recom Step-Down DC/DC-Regulator; ki_description: 300mA Step-Down DC/DC-Regulator, 36-72V input, 24V fixed Output Voltage, LM78xx replacement, -40°C to +85°C, SIP3; ki_fp_filters: Converter*DCDC*RECOM*R*78HB*0.5*; Footprint: Converter_DCDC:Converter_DCDC_RECOM_R-78HB-0.5_THT; Supplier: https://www.recom-power.com/pdf/Innoline/R-78HBxx-0.5_L.pdf
footprint Converter_DCDC_RECOM_R-78HB-0.5_THT
pins: 1 IN (power), 2 GND (power), 3 OUT (power)

## R-78S3.3-0.1
designator *  value R-78S3.3-0.1
ki_keywords: dc-dc recom Step-Down DC/DC-Regulator; ki_description: 100mA Step-Up DC/DC-Regulator, 0.65-3.15V input, 3.3V fixed Output Voltage, LM78xx replacement, -40°C to +85°C, SIP4; ki_fp_filters: Converter*DCDC*RECOM*R*78S*0.1*; Footprint: Converter_DCDC:Converter_DCDC_RECOM_R-78S-0.1_THT; Supplier: https://www.recom-power.com/pdf/Innoline/R-78Sxx-0.1.pdf
footprint Converter_DCDC_RECOM_R-78S-0.1_THT
pins: 1 IN (power), 2 GND (power), 3 OUT (power), 4 CTRL (in)

## R-781.5-0.5
designator *  value R-781.5-0.5
ki_keywords: dc-dc recom Step-Down DC/DC-Regulator; ki_description: 500mA Step-Down DC/DC-Regulator, 4.75-30V input, 1.5V fixed Output Voltage, LM78xx replacement, -40°C to +85°C, SIP3; ki_fp_filters: Converter*DCDC*RECOM*R*78E*0.5*; Footprint: Converter_DCDC:Converter_DCDC_RECOM_R-78E-0.5_THT; Supplier: https://www.recom-power.com/pdf/Innoline/R-78xx-0.5.pdf
footprint Converter_DCDC_RECOM_R-78E-0.5_THT
pins: 1 IN (power), 2 GND (power), 3 OUT (power)

## R-781.8-0.5
designator *  value R-781.8-0.5
ki_keywords: dc-dc recom Step-Down DC/DC-Regulator; ki_description: 500mA Step-Down DC/DC-Regulator, 4.75-32V input, 1.8V fixed Output Voltage, LM78xx replacement, -40°C to +85°C, SIP3; ki_fp_filters: Converter*DCDC*RECOM*R*78E*0.5*; Footprint: Converter_DCDC:Converter_DCDC_RECOM_R-78E-0.5_THT; Supplier: https://www.recom-power.com/pdf/Innoline/R-78xx-0.5.pdf
footprint Converter_DCDC_RECOM_R-78E-0.5_THT
pins: 1 IN (power), 2 GND (power), 3 OUT (power)

## R-781.8-1.0
designator *  value R-781.8-1.0
ki_keywords: dc-dc recom Step-Down DC/DC-Regulator; ki_description: 1A Step-Down DC/DC-Regulator, 4.75-18V input, 1.8V fixed Output Voltage, LM78xx replacement, -40°C to +85°C, SIP3; ki_fp_filters: Converter*DCDC*RECOM*R*78E*0.5*; Footprint: Converter_DCDC:Converter_DCDC_RECOM_R-78E-0.5_THT; Supplier: https://www.recom-power.com/pdf/Innoline/R-78xx-1.0.pdf
footprint Converter_DCDC_RECOM_R-78E-0.5_THT
pins: 1 IN (power), 2 GND (power), 3 OUT (power)

## R-782.5-0.5
designator *  value R-782.5-0.5
ki_keywords: dc-dc recom Step-Down DC/DC-Regulator; ki_description: 500mA Step-Down DC/DC-Regulator, 4.75-18V input, 2.5V fixed Output Voltage, LM78xx replacement, -40°C to +85°C, SIP3; ki_fp_filters: Converter*DCDC*RECOM*R*78E*0.5*; Footprint: Converter_DCDC:Converter_DCDC_RECOM_R-78E-0.5_THT; Supplier: https://www.recom-power.com/pdf/Innoline/R-78xx-0.5.pdf
footprint Converter_DCDC_RECOM_R-78E-0.5_THT
pins: 1 IN (power), 2 GND (power), 3 OUT (power)